# Altium footprint library L1.PcbLib: 21 footprints (part 2 of 2)
Each footprint in its own frame and in the unit in brackets; x right, y up, seen from the top. Pads: shape width x height; smd on the part's side, far side on the other; paste and mask are expansions set on the pad; w line width, h text height; cw(c..) or ccw(c..) is an arc to the next point about the centre after c.
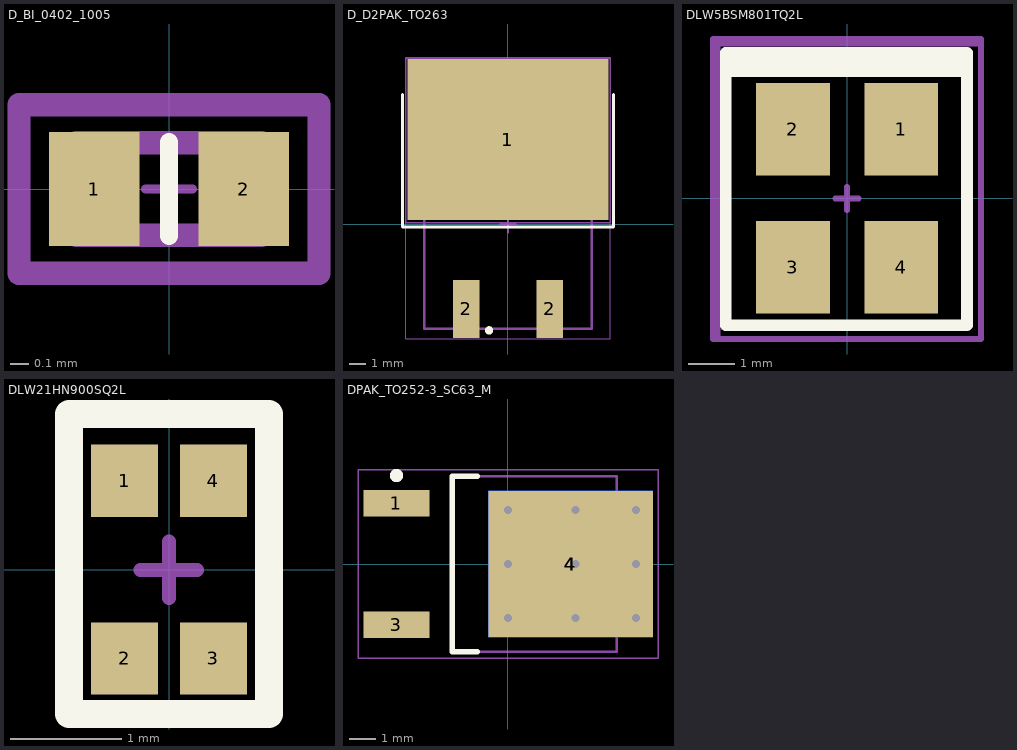
[diagram p1: the footprints below, top view; thin cyan lines are the x and y axes]

## D_BI_0402_1005 [mm]
pads (2):
  rect 0.49x0.62 smd: 1(-0.405,0) 2(0.405,0)
Top Overlay:
  lines w0.1: 0,-0.254 0,0.254
Mechanical 13:
  lines w0.127: -0.5,-0.25 -0.5,0.25 0.5,0.25 0.5,-0.25 -0.5,-0.25
Mechanical 15:
  lines w0.051: -0.127,0 0.127,0 ; 0,-0.127 0,0.127
  lines w0.127: -0.813,-0.457 0.813,-0.457 0.813,0.457 -0.813,0.457 -0.813,-0.457
Mechanical 17:
  text ".Designator" at -0.356,-0.127 h0.25
Mechanical 19:
  text "'.Comment'" at -0.33,-0.127 h0.25
3D body "diode_bi_0402.step": height 0.48, standoff -0.02, extent -0.5,-0.3 0.5,0.3

## D_D2PAK_TO263 [mm] "D2PAK footrpint from ST"
height 4.6
pads (3):
  rect 12.2x9.75 smd: 1(0,5.138)
  rect 1.6x3.5 smd: 2(-2.54,-5.138) 2(2.54,-5.138)
Top Overlay:
  circle w0.25: c-1.15,-6.438 r0.125
  lines w0.2: -6.4,-0.163 6.4,-0.163 6.4,7.862 ; -6.4,-0.112 -6.4,7.862
Mechanical 13:
  lines w0.1: -6.2,0.088 6.2,0.088 6.2,10.087 -6.2,10.087 -6.2,0.088
  lines w0.127: -5.08,-6.341 -5.08,8.923 5.08,8.923 5.08,-6.341 -5.08,-6.341
Mechanical 15:
  lines w0.05: -6.2,-6.963 6.2,-6.963 6.2,10.087 -6.2,10.087 -6.2,-6.963
  lines w0.1: -0.5,0 0.5,0 ; 0,-0.5 0,0.5
Mechanical 17:
  text "'.Designator'" at -4.826,-2.54 h0.51
Mechanical 19:
  text "'.Comment'" at -4.826,-2.54 h0.51
3D body "User Library-DPAK.step": height 4.98, standoff -0.03, extent -5.08,-6.341 5.08,8.923

## DLW5BSM801TQ2L [mm]
pads (4):
  rect 1.6x2 smd: 1(1.174,1.495) 2(-1.173,1.495) 3(-1.173,-1.495) 4(1.174,-1.495)
Top Overlay:
  lines w0.254: -2.627,2.752 2.598,2.752 ; -2.627,2.952 2.598,2.952 ; -2.627,-2.748 -2.627,3.152 2.598,3.152 2.598,-2.748 -2.627,-2.748
Mechanical 13:
  lines w0.127: -2.802,-3.048 2.898,-3.048 2.898,3.352 -2.802,3.352 -2.802,-3.048
Mechanical 15:
  lines w0.127: -0.256,-0.003 0.252,-0.003 ; -0.002,-0.257 -0.002,0.251 ; -2.902,-3.048 -2.902,3.452 2.898,3.452 2.898,-3.048 -2.902,-3.048
Mechanical 17:
  text "'.Designator'" at -2.9,-0.2 h0.51
Mechanical 19:
  text "'.Comment'" at -2.3,-0.3 h0.51
3D body "User Library-DLW5BT.STEP": height 2.45, standoff 0, extent -2.501,-2.498 2.499,2.502

## DLW21HN900SQ2L [mm]
pads (4):
  rect 0.6x0.65 smd: 1(-0.4,0.8) 2(-0.4,-0.8) 3(0.4,-0.8) 4(0.4,0.8)
Top Overlay:
  lines w0.254: -0.9,-1.3 0.9,-1.3 0.9,1.4 -0.9,1.4 -0.9,-1.3
Mechanical 13:
  lines w0.127: -0.9,-1.3 -0.9,1.4 0.9,1.4 0.9,-1.3 -0.9,-1.3
Mechanical 15:
  lines w0.127: -0.256,-0.003 0.252,-0.003 ; -0.002,-0.257 -0.002,0.251 ; -0.9,-1.3 0.9,-1.3 0.9,1.4 -0.9,1.4 -0.9,-1.3
Mechanical 17:
  text "'.Designator'" at -0.2,1.2 h0.51
Mechanical 19:
  text "'.Comment'" at -0.2,1.1 h0.51
3D body "User Library-EMI Filter DLW21S.step": height 1.2, standoff 0, extent -0.601,-0.998 0.599,1.002

## DPAK_TO252-3_SC63_M [mm] "D-PAK, 3-Pads+1-heatsink, Body 6,20x6,60mm (max), IPC Medium Density"
height 2.4
pads (4):
  rect 2.5x1 smd: 1(-4.2,2.28) 3(-4.2,-2.28)
  rect 6.2x5.5 smd far side: 4(2.35,0)
  rect 6.2x5.5 smd: 4(2.362,0)
via 0,2.032 diameter 0.8 hole 0.3
via 0,-2.032 diameter 0.8 hole 0.3
via 4.826,2.032 diameter 0.8 hole 0.3
via 4.826,-2.032 diameter 0.8 hole 0.3
via 2.54,0 diameter 0.8 hole 0.3
via 2.54,2.032 diameter 0.8 hole 0.3
via 2.54,-2.032 diameter 0.8 hole 0.3
via 4.826,0 diameter 0.8 hole 0.3
via 0,0 diameter 0.8 hole 0.3
Top Overlay:
  circle w0.25: c-4.2,3.33 r0.125
  lines w0.2: -1.15,-3.3 -2.1,-3.3 -2.1,3.3 -1.15,3.3
Top Paste:
  rectangle: 2.794,0.254 4.572,2.032
  region: 2.032,0.254 2.032,2.032 0.254,2.032 0.254,0.254
  region: 2.032,-0.254 0.254,-0.254 0.254,-2.032 2.032,-2.032
  region: 2.794,-0.254 2.794,-2.032 4.572,-2.032 4.572,-0.254
Mechanical 13:
  lines w0.1: -2.1,-3.3 -2.1,3.3 4.1,3.3 4.1,-3.3 -2.1,-3.3
Mechanical 15:
  lines w0.05: -5.65,-3.55 -5.65,3.55 5.65,3.55 5.65,-3.55 -5.65,-3.55
  lines w0.1: -0.5,0 0.5,0 ; 0,-0.5 0,0.5
Mechanical 17:
  text "'.Designator'" at -1.016,-2.286 h0.64
Mechanical 19:
  text "'.Comment'" at -1.016,-2.286 h0.64
3D body "User Library-DPAK_TO-252AA.step": height 2.37, standoff -0.03, extent -5.08,-3.367 5.02,3.367